# Altium footprint library SMT.PcbLib: 325 footprints (part 12 of 21)
Each footprint in its own frame and in the unit in brackets; x right, y up, seen from the top. Pads: shape width x height; smd on the part's side, far side on the other; paste and mask are expansions set on the pad; w line width, h text height; cw(c..) or ccw(c..) is an arc to the next point about the centre after c.
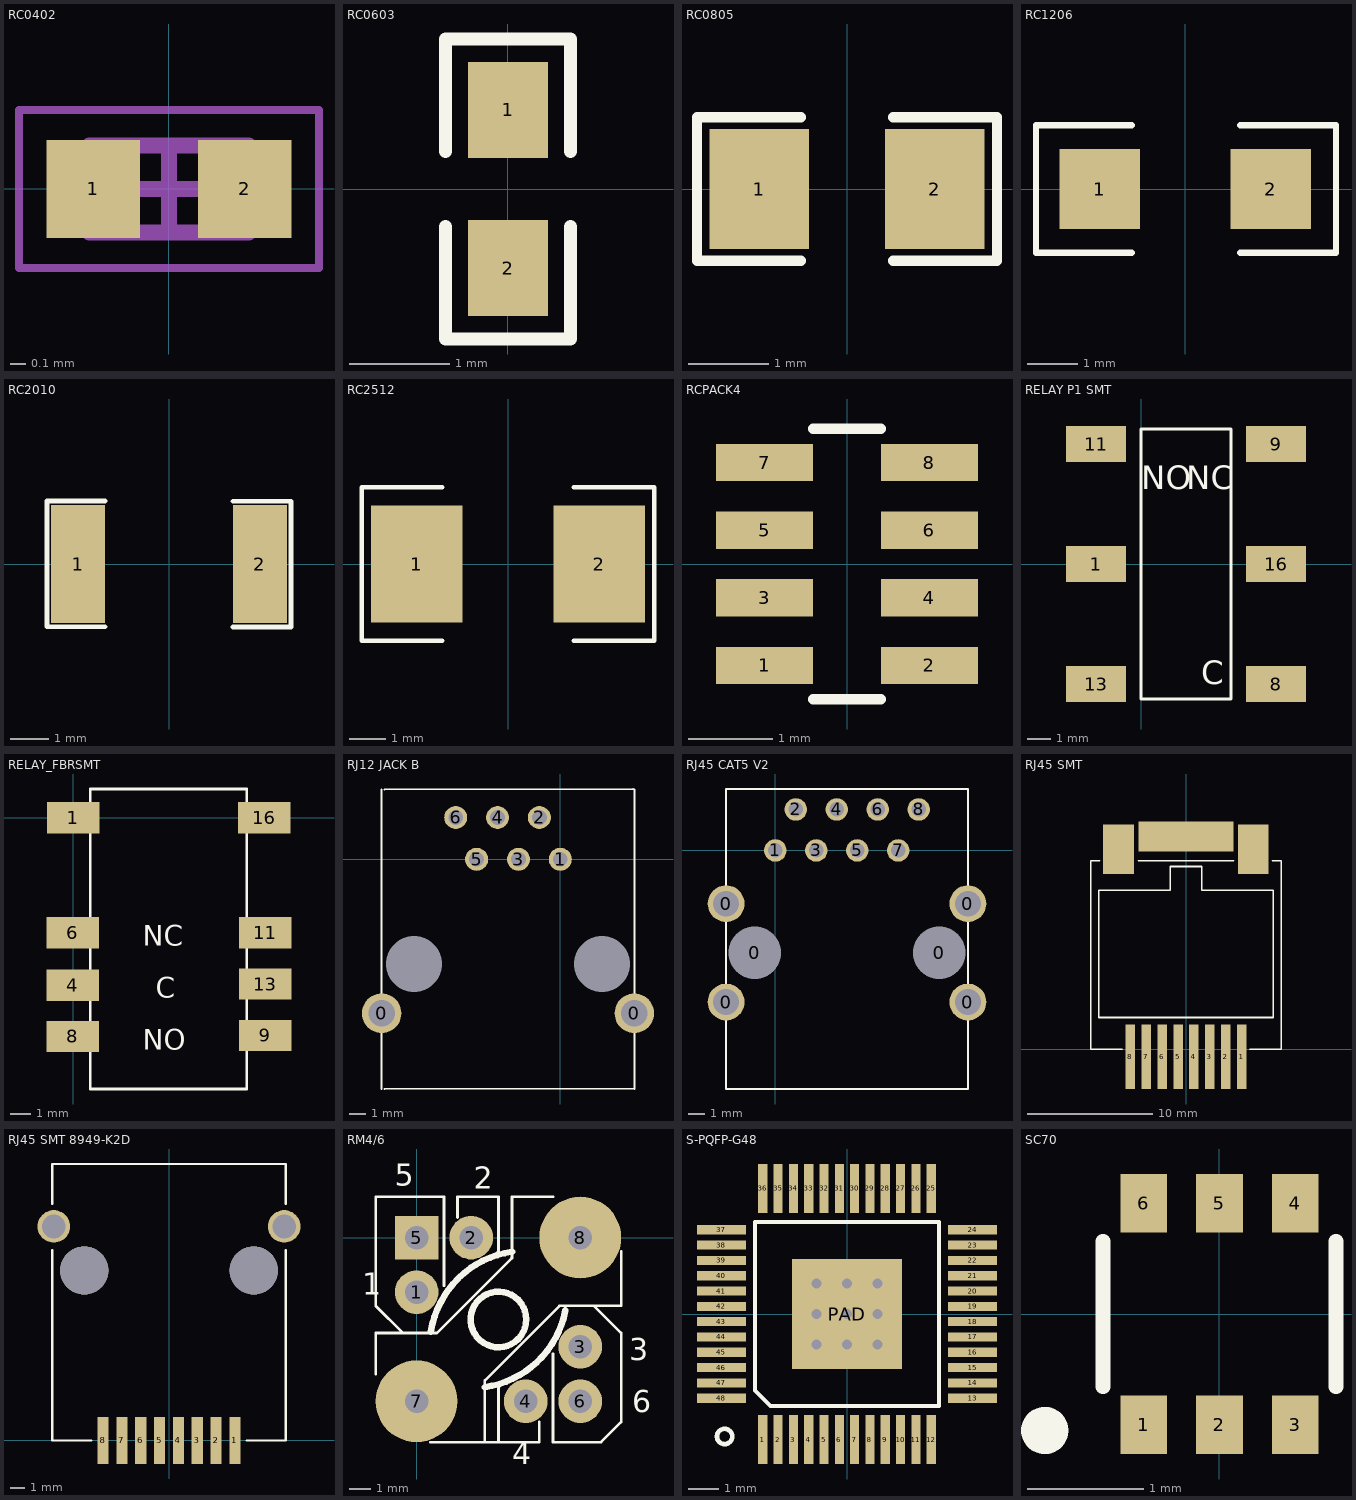
[diagram p11: the footprints below, top view; thin cyan lines are the x and y axes]

## RC0402 [mm] "Chip Inductor, 2-Leads, Body 1.00x0.50mm, IPC Medium Density"
height 0.4
pads (2):
  rect 0.59x0.62 smd: 1(-0.48,0) 2(0.48,0)
Mechanical13:
  lines w0.1: -0.505,-0.275 -0.505,0.275 0.505,0.275 0.505,-0.275 -0.505,-0.275
Mechanical15:
  lines w0.05: -0.95,-0.5 -0.95,0.5 0.95,0.5 0.95,-0.5 -0.95,-0.5
  lines w0.1: -0.275,0 0.275,0 ; 0,-0.275 0,0.275
3D body: height 0.4, standoff 0, extent -0.255,-0.275 0.255,0.275
3D body: height 0.4, standoff 0, extent -0.505,-0.275 -0.255,0.275
3D body: height 0.4, standoff 0, extent 0.255,-0.275 0.505,0.275

## RC0603 [mm]
pads (2):
  rect 0.8x0.96 smd: 1(0,0.79) 2(0,-0.79)
TopOverlay:
  lines w0.127: -0.625,-0.375 -0.625,-1.5 0.625,-1.5 0.625,-0.375 ; -0.625,0.375 -0.625,1.5 0.625,1.5 0.625,0.375
3D body: height 0.45, standoff 0, extent -0.4,-0.8 0.4,0.8

## RC0805 [mm]
pads (2):
  rect 1.25x1.5 smd: 1(-1.1,0) 2(1.1,0)
TopOverlay:
  lines w0.127: -0.58,-0.9 -1.88,-0.9 -1.88,0.9 -0.58,0.9 ; 0.58,-0.9 1.88,-0.9 1.88,0.9 0.58,0.9
3D body: height 1.35, standoff 0, extent -1,-0.675 1,0.675

## RC1206 [mil]
pads (2):
  rect 63x63 smd: 1(-67,0) 2(67,0)
TopOverlay:
  lines w5: -42,-50 -117,-50 -117,50 -42,50 ; 43,-50 118,-50 118,50 43,50
3D body: height 21.65, standoff 0, extent -61.02,-30.51 61.02,30.51

## RC2010 [mm]
pads (2):
  rect 1.4x3.05 smd: 1(-2.35,0) 2(2.35,0)
TopOverlay:
  lines w0.127: -1.65,-1.62 -3.15,-1.62 -3.15,1.63 -1.65,1.63 ; 1.65,-1.63 3.15,-1.63 3.15,1.62 1.65,1.62

## RC2512 [mm]
pads (2):
  rect 2.5x3.2 smd: 1(-2.5,0) 2(2.5,0)
TopOverlay:
  lines w0.127: -1.8,-2.1 -4,-2.1 -4,2.1 -1.8,2.1 ; 1.8,-2.1 4,-2.1 4,2.1 1.8,2.1

## RCPACK4 [mm] "CAT16-101J4LF"
height 0.5
pads (8):
  rect 1.15x0.44 smd: 1(-0.975,-1.2) 2(0.975,-1.2) 3(-0.975,-0.4) 4(0.975,-0.4) 5(-0.975,0.4) 6(0.975,0.4) 7(-0.975,1.2) 8(0.975,1.2)
TopOverlay:
  lines w0.127: -0.4,-1.6 0,-1.6 0.4,-1.6 ; -0.4,1.6 0,1.6 0.4,1.6

## RELAY P1 SMT [mil]
pads (6):
  rect 100x60 smd: 1(-75,0) 8(225,-200) 9(225,200) 11(-75,200) 13(-75,-200) 16(225,0)
TopOverlay:
  lines w5: 0,-225 0,225 150,225 150,-225 0,-225
  text "NO" at 0,125 h39.37
  text "NC" at 75,125 h39.37
  text "C" at 100,-200 h39.37

## RELAY_FBRSMT [mm]
pads (8):
  rect 2.54x1.524 smd: 1(0,0) 4(-0.03,-8.15) 6(-0.03,-5.6) 8(-0.03,-10.65) 9(9.35,-10.6) 11(9.35,-5.6) 13(9.35,-8.1) 16(9.3,0)
TopOverlay:
  lines w0.127: 0.83,-13.208 8.45,-13.208 8.45,1.397 0.83,1.397 0.83,-13.208
  text "C" at 4.005,-8.763 h1
  text "NC" at 3.37,-6.223 h1
  text "NO" at 3.37,-11.303 h1

## RJ12 JACK B [mil]
pads (10):
  round 94.49 hole 62.99: 0(-427.17,-368.11) 0(177.16,-368.11)
  round 0 on Mech1 hole 133.86 unplated: 0(-350,-250) 0(100,-250)
  round 55 hole 35.43: 1(0,0) 2(-50,100) 3(-100,0) 4(-150,100) 5(-200,0) 6(-250,100)
TopOverlay:
  lines w5: -427.17,-549.21 -427.17,167.32 ; -420.28,-549.21 176.97,-548.42 ; -420.28,167.32 174.21,168.11 ; 177.16,-549.21 177.16,167.32

## RJ45 CAT5 V2 [mm]
pads (14):
  round 2.286 hole 1.6: 0(-3.05,-9.4) 0(-3.05,-3.3) 0(11.94,-9.4) 0(11.94,-3.3)
  round 3.2 on Mech1 hole 3.25 unplated: 0(-1.27,-6.35) 0(10.16,-6.35)
  round 1.397 hole 0.9: 1(0,0) 2(1.27,2.54) 3(2.54,0) 4(3.81,2.54) 5(5.08,0) 6(6.35,2.54) 7(7.62,0) 8(8.89,2.54)
TopOverlay:
  lines w0.127: -3.055,-14.79 11.945,-14.79 11.945,3.81 -3.055,3.81 -3.055,-14.79

## RJ45 SMT [mm] "MOLEX  JACK, RJ45, VERTICAL, 8/8, P/N 2060705"
height 0.399
pads (11):
  rect 0.76x5.15 smd: 1(4.445,-0.595) 2(3.175,-0.595) 3(1.905,-0.595) 4(0.635,-0.595) 5(-0.635,-0.595) 6(-1.905,-0.595) 7(-3.175,-0.595) 8(-4.445,-0.595)
  rect 2.45x3.95 smd: ""(-5.39,15.98) ""(5.38,15.98)
  rect 7.6x2.4 smd: ""(0,17)
TopOverlay:
  lines w0.127: -6.891,15.08 -7.62,15.08 -7.62,0 -5.08,0 ; -3.81,15.08 0,15.08 3.81,15.08 ; 5.08,0 7.62,0 7.62,15.08 6.891,15.08 ; -6.985,2.54 6.985,2.54 6.985,12.7 1.27,12.7 1.27,14.605 -1.27,14.605 -1.27,12.7 -6.985,12.7 -6.985,2.54

## RJ45 SMT 8949-K2D [mm] "8P8C RJ45 Modulaer surface mount"
height 0.298
pads (12):
  rect 0.76x3.18 smd: 1(4.445,0) 2(3.175,0) 3(1.905,0) 4(0.635,0) 5(-0.635,0) 6(-1.905,0) 7(-3.175,0) 8(-4.445,0)
  round 2.2 hole 1.6: ""(-7.77,14.44) ""(7.77,14.44)
  round 3.25 hole 3.25 unplated: ""(-5.715,11.47) ""(5.715,11.47)
TopOverlay:
  lines w0.152: -7.87,12.855 -7.87,0 -5.25,0 ; -7.87,15.955 -7.87,18.65 7.87,18.65 7.87,15.955 ; 5.25,0 7.87,0 7.87,12.855

## RM4/6 [mil]
pads (8):
  round 80 hole 43: 1(0,-100) 2(100,0) 3(300,-200) 4(200,-300) 6(300,-300)
  rect 80x80 hole 43: 5(0,0)
  round 150 hole 43: 7(0,-300) 8(300,0)
TopOverlay:
  circle w12: c150,-150 r51
  lines w5: -75,-250 -75,-175 37,-175 174,-38 175,-37 ; -25,-175 -75,-125 -75,75 -62,75 50,75 50,-50 50,-88 ; 25,-375 225,-375 ; 75,37 75,75 150,75 150,-25 ; 125,-375 125,-262 262,-125 375,-125 375,-25 ; 150,-275 150,-375 225,-375 ; 175,-38 175,75 250,75 ; 225,-338 225,-375 ; 250,-213 250,-375 338,-375 375,-338 375,-313 375,-175 ; 325,-125 375,-175 ; 375,-225 375,-175
  lines w12: 26.17,-172.47 cw(c200,-200) 175.51,-25.71 ; 124.49,-274.29 ccw(c100,-100) 272.77,-133.58
  text "4" at 175,-415 h40
  text "2" at 105,90 h40
  text "6" at 395,-320 h40
  text "5" at -40,95 h40
  text "3" at 390,-225 h40
  text "1" at -100,-105 h40

## S-PQFP-G48 [mm] "48 PIN WITH POWER PAD"
height 0.03
pads (49):
  rect 0.3x1.6 smd: 1(-2.75,-4.1) 2(-2.25,-4.1) 3(-1.75,-4.1) 4(-1.25,-4.1) 5(-0.75,-4.1) 6(-0.25,-4.1) 7(0.25,-4.1) 8(0.75,-4.1) 9(1.25,-4.1) 10(1.75,-4.1) 11(2.25,-4.1) 12(2.75,-4.1) 25(2.75,4.1) 26(2.25,4.1) 27(1.75,4.1) 28(1.25,4.1) 29(0.75,4.1) 30(0.25,4.1) 31(-0.25,4.1) 32(-0.75,4.1) 33(-1.25,4.1) 34(-1.75,4.1) 35(-2.25,4.1) 36(-2.75,4.1)
  rect 1.6x0.3 smd: 13(4.1,-2.75) 14(4.1,-2.25) 15(4.1,-1.75) 16(4.1,-1.25) 17(4.1,-0.75) 18(4.1,-0.25) 19(4.1,0.25) 20(4.1,0.75) 21(4.1,1.25) 22(4.1,1.75) 23(4.1,2.25) 24(4.1,2.75) 37(-4.1,2.75) 38(-4.1,2.25) 39(-4.1,1.75) 40(-4.1,1.25) 41(-4.1,0.75) 42(-4.1,0.25) 43(-4.1,-0.25) 44(-4.1,-0.75) 45(-4.1,-1.25) 46(-4.1,-1.75) 47(-4.1,-2.25) 48(-4.1,-2.75)
  rect 3.6x3.6 smd: PAD(0,0)
via -1,1 diameter 0.55 hole 0.33
via -1,0 diameter 0.55 hole 0.33
via -1,-1 diameter 0.55 hole 0.33
via 0,-1 diameter 0.55 hole 0.33
via 1,-1 diameter 0.55 hole 0.33
via 1,0 diameter 0.55 hole 0.33
via 1,1 diameter 0.55 hole 0.33
via 0,1 diameter 0.55 hole 0.33
via 0,0 diameter 0.55 hole 0.33
TopOverlay:
  circle w0.152: c-4,-4 r0.25
  lines w0.127: -3,-2.5 -3,3 3,3 3,-3 -2.5,-3 -3,-2.5
3D body: height 1.2, standoff 0, extent -3.4,-3.4 3.4,3.4

## SC70 [mm]
height 1.1
pads (6):
  rect 0.4x0.5 smd: 1(-0.65,-0.95) 2(0,-0.95) 3(0.65,-0.95) 4(0.65,0.95) 5(0,0.95) 6(-0.65,0.95)
TopOverlay:
  circle w0.254: c-1.5,-1 r0.075
  lines w0.127: -1,-0.625 -1,0 -1,0.625 ; 1,-0.625 1,0 1,0.625
3D body: height 1.1, standoff 0, extent -1,-0.625 1,0.625
3D body: height 0.8, standoff 0.5, extent -0.8,-0.875 -0.5,-0.625
3D body: height 0.3, standoff 0, extent -0.8,-1.125 -0.5,-0.875
3D body: height 0.5, standoff 0, extent -0.8,-0.875 -0.5,-0.75
3D body: height 0.5, standoff 0, extent -0.15,-0.875 0.15,-0.75
3D body: height 0.3, standoff 0, extent -0.15,-1.125 0.15,-0.875
3D body: height 0.8, standoff 0.5, extent -0.15,-0.875 0.15,-0.625
3D body: height 0.5, standoff 0, extent 0.5,-0.875 0.8,-0.75
3D body: height 0.3, standoff 0, extent 0.5,-1.125 0.8,-0.875
3D body: height 0.8, standoff 0.5, extent 0.5,-0.875 0.8,-0.625
3D body: height 0.5, standoff 0, extent 0.5,0.75 0.8,0.875
3D body: height 0.3, standoff 0, extent 0.5,0.875 0.8,1.125
3D body: height 0.8, standoff 0.5, extent 0.5,0.625 0.8,0.875
3D body: height 0.5, standoff 0, extent -0.15,0.75 0.15,0.875
3D body: height 0.3, standoff 0, extent -0.15,0.875 0.15,1.125
3D body: height 0.8, standoff 0.5, extent -0.15,0.625 0.15,0.875
3D body: height 0.5, standoff 0, extent -0.8,0.75 -0.5,0.875
3D body: height 0.3, standoff 0, extent -0.8,0.875 -0.5,1.125
3D body: height 0.8, standoff 0.5, extent -0.8,0.625 -0.5,0.875